# Altium footprint library HW_HOLLAND_NCDM_MONITOR_R1.PcbLib: 472 footprints (part 22 of 30)
Each footprint in its own frame and in the unit in brackets; x right, y up, seen from the top. Pads: shape width x height; smd on the part's side, far side on the other; paste and mask are expansions set on the pad; w line width, h text height; cw(c..) or ccw(c..) is an arc to the next point about the centre after c.
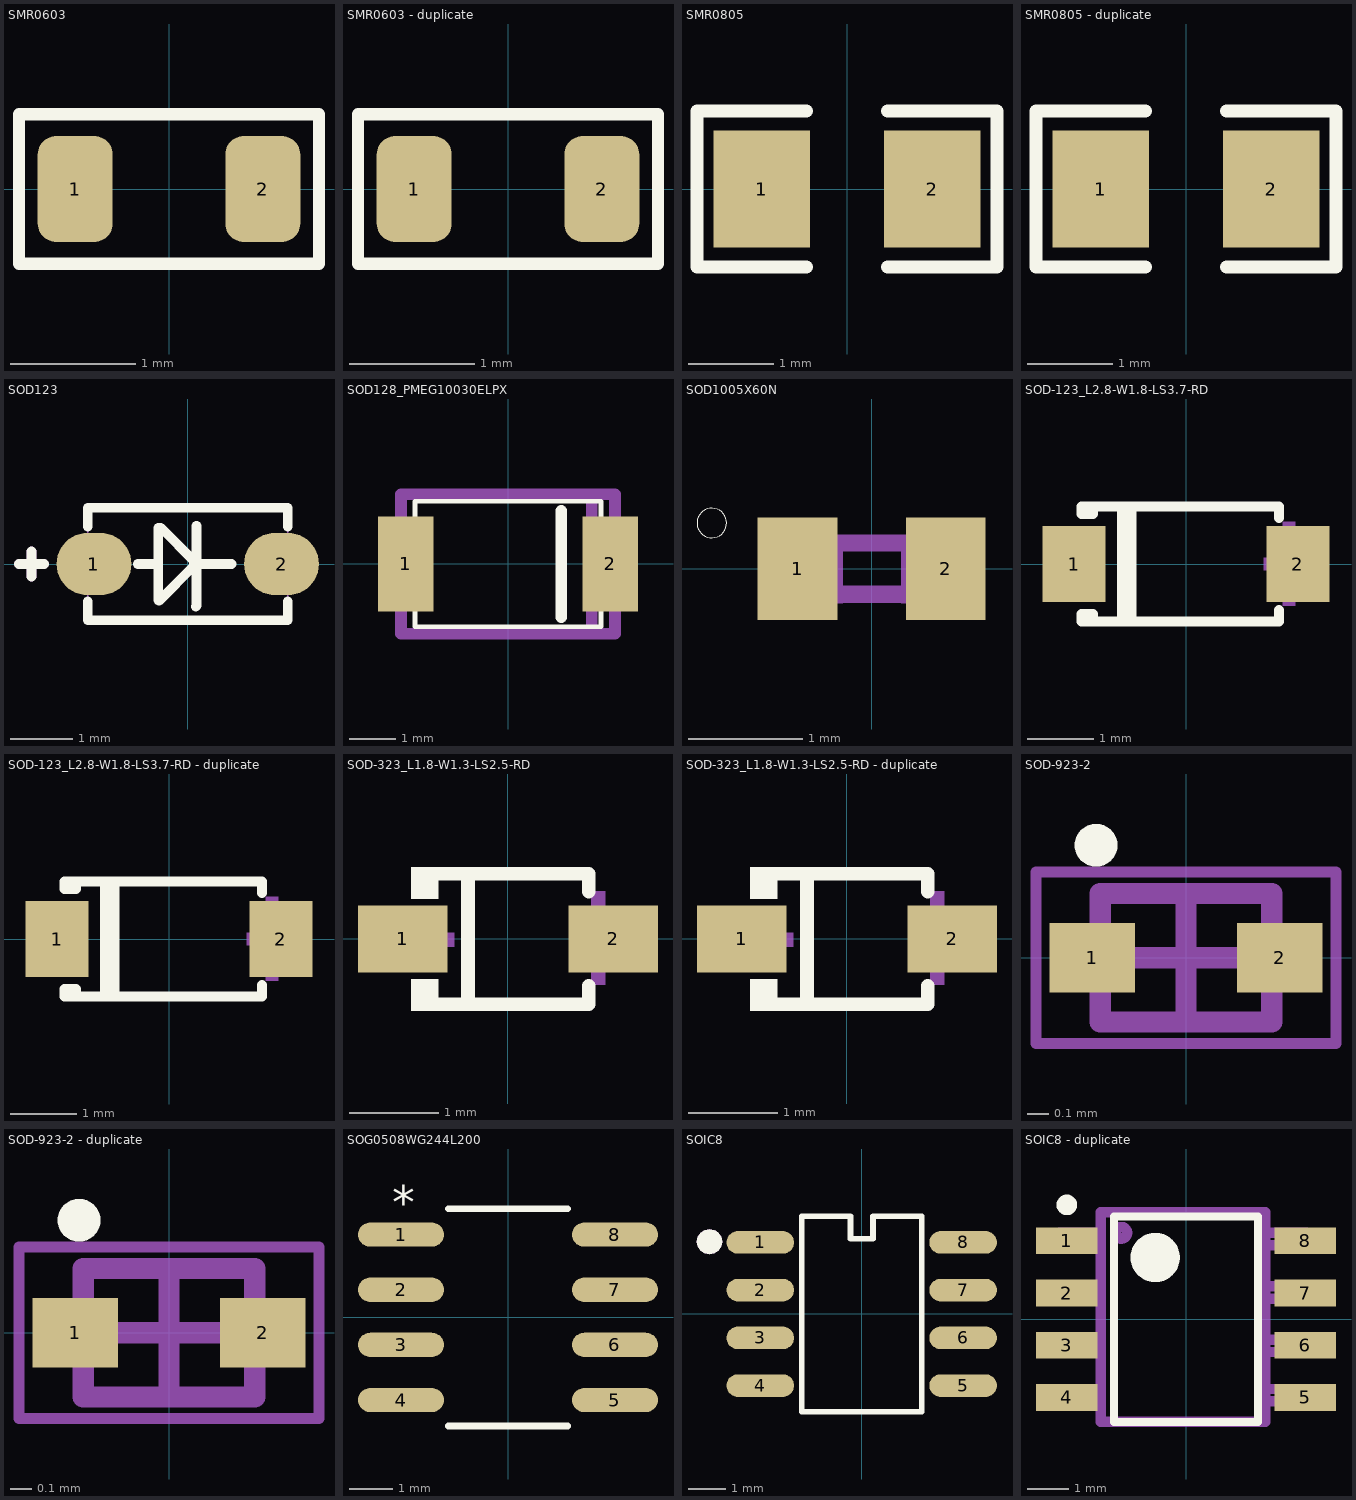
[diagram p21: the footprints below, top view; thin cyan lines are the x and y axes]

## SMR0603 [mm]
pads (2):
  rrect50% 0.6x0.85 smd: 1(-0.75,0) 2(0.75,0)
Top Overlay:
  lines w0.1: -1.2,-0.6 1.2,-0.6 1.2,0.6 -1.2,0.6 -1.2,-0.6
3D body "SMD R-0603.STEP": height 0.45, standoff -0.01, extent -0.8,-0.4 0.8,0.4

## SMR0603 - duplicate [mm]
pads (2):
  rrect50% 0.6x0.85 smd: 1(-0.75,0) 2(0.75,0)
Top Overlay:
  lines w0.1: -1.2,-0.6 1.2,-0.6 1.2,0.6 -1.2,0.6 -1.2,-0.6
3D body "SMD R-0603.STEP": height 0.45, standoff -0.01, extent -0.8,-0.4 0.8,0.4

## SMR0805 [mm]
pads (2):
  rect 1.133x1.377 smd: 1(-1,0) 2(1,0)
Top Overlay:
  lines w0.152: -0.476,-0.917 -1.761,-0.917 -1.761,0.917 -0.476,0.917 ; 0.476,-0.917 1.761,-0.917 1.761,0.917 0.476,0.917
3D body "User Library-0805 SMD Resistor.step": height 0.78, standoff 0, extent -1,-0.625 1,0.625

## SMR0805 - duplicate [mm]
pads (2):
  rect 1.133x1.377 smd: 1(-1,0) 2(1,0)
Top Overlay:
  lines w0.152: -0.476,-0.917 -1.761,-0.917 -1.761,0.917 -0.476,0.917 ; 0.476,-0.917 1.761,-0.917 1.761,0.917 0.476,0.917
3D body "User Library-0805 SMD Resistor.step": height 0.78, standoff 0, extent -1,-0.625 1,0.625

## SOD123 [mm] "SOD123"
height 3.5
pads (2):
  oval 1.2x1 smd: 1(-1.5,0) 2(1.5,0)
Top Overlay:
  lines w0.152: -2.7,0 -2.3,0 ; -2.5,-0.2 -2.5,0.2 ; -1.6,-0.6 -1.6,-0.9 1.6,-0.9 1.6,-0.6 ; -1.6,0.6 -1.6,0.9 1.6,0.9 1.6,0.6 ; -0.8,0 -0.53,0 ; 0.1,0 0.7,0 ; 0.13,-0.68 0.14,-0.67 0.14,0.61 ; -0.47,-0.58 -0.46,-0.59 0.11,-0.02 0.11,0.04 -0.43,0.58 -0.47,0.58 -0.47,-0.58
  text ".Designator" at 4.2,0.4 h0.76
Top Assembly:
  lines w0.025: -1.6,-0.9 1.6,-0.9 1.6,0.9 -1.6,0.9 -1.6,-0.9
  lines w0.152: -2.7,0 -2.3,0 ; -2.5,-0.2 -2.5,0.2
Mechanical 21:
  text "2" at 1.246,0 h0.64
  text "1" at -1.754,0 h0.64
3D body "User Library-SOD-123_DiodesInc.STEP": height 1.48, standoff 0.03, extent -1.893,-0.859 1.957,0.841

## SOD128_PMEG10030ELPX [mm]
pads (2):
  rect 1.2x2.05 smd: 1(-2.2,0) 2(2.2,0)
Top Overlay:
  lines w0.1: -2,-1.35 2,-1.35 2,1.35 -2,1.35 -2,-1.35
  lines w0.254: 1.143,-1.143 1.143,1.143
Top Designator:
  lines w0.254: 1.8,-1.5 1.8,1.5 ; -2.3,-1.5 2.3,-1.5 2.3,1.5 -2.3,1.5 -2.3,-1.5
  text ".Designator" at -2.812,-0.282 h1.25
3D body "SOD128_PMEG10030ELPX.step": height 1.1, standoff 0, extent -2.35,-1.35 2.35,1.35

## SOD1005X60N [mm]
pads (2):
  rect 0.7x0.9 smd: 1(-0.65,0) 2(0.65,0)
Top Overlay:
  circle w0: c-1.403,0.4 r0.13
Mechanical 13:
  region: -0.254,-0.305 -0.555,-0.305 -0.555,0.295 -0.254,0.295
  region: 0.559,-0.305 0.259,-0.305 0.259,0.295 0.559,0.295
  lines w0.152: -0.245,-0.224 0.245,-0.224 ; -0.245,0.224 0.245,0.224
3D body "ctvs_cd_all.step": height 1.23, standoff 0.01, extent -1.07,-0.61 1.07,0.61

## SOD-123_L2.8-W1.8-LS3.7-RD [mm]
pads (2):
  rect 0.95x1.15 smd: 1(-1.693,0) 2(1.693,0)
Top Overlay:
  lines w0.152: -0.97,-0.866 -0.97,0.866 ; -0.827,-0.866 -0.827,0.866 ; 1.406,-0.698 1.406,-0.866 -1.406,-0.866 ; 1.406,0.698 1.406,0.866 -1.406,0.866 ; -1.406,-0.866 -1.58,-0.866 -1.58,-0.755 -1.406,-0.755 -1.406,-0.866 ; -1.406,0.866 -1.58,0.866 -1.58,0.755 -1.406,0.755 -1.406,0.866
Mechanical 15:
  region: -2.03,0.095 -2.03,-0.095 -1.272,-0.095 -1.272,0.095
  region: 1.935,0.098 1.935,-0.092 1.177,-0.092 1.177,0.098
  region: 1.651,0.635 1.651,-0.629 1.461,-0.629 1.461,0.635
3D body "sod123.STEP": height 0.96, standoff -0.01, extent -1.979,-0.963 1.979,0.963

## SOD-123_L2.8-W1.8-LS3.7-RD - duplicate [mm]
pads (2):
  rect 0.95x1.15 smd: 1(-1.693,0) 2(1.693,0)
Top Overlay:
  lines w0.152: -0.97,-0.866 -0.97,0.866 ; -0.827,-0.866 -0.827,0.866 ; 1.406,-0.698 1.406,-0.866 -1.406,-0.866 ; 1.406,0.698 1.406,0.866 -1.406,0.866 ; -1.406,-0.866 -1.58,-0.866 -1.58,-0.755 -1.406,-0.755 -1.406,-0.866 ; -1.406,0.866 -1.58,0.866 -1.58,0.755 -1.406,0.755 -1.406,0.866
Mechanical 15:
  region: -2.03,0.095 -2.03,-0.095 -1.272,-0.095 -1.272,0.095
  region: 1.935,0.098 1.935,-0.092 1.177,-0.092 1.177,0.098
  region: 1.651,0.635 1.651,-0.629 1.461,-0.629 1.461,0.635
3D body "sod123.STEP": height 0.96, standoff -0.01, extent -1.979,-0.963 1.979,0.963

## SOD-323_L1.8-W1.3-LS2.5-RD [mm]
pads (2):
  rect 1x0.75 smd: 1(-1.173,0) 2(1.173,0)
Top Overlay:
  region: -0.775,-0.802 -0.775,-0.45 -1.08,-0.45 -1.08,-0.802
  region: -0.775,0.802 -0.775,0.45 -1.08,0.45 -1.08,0.802
  lines w0.152: -0.851,-0.726 0.901,-0.726 0.901,-0.52 ; -0.851,0.726 0.901,0.726 0.901,0.53 ; -0.447,-0.726 -0.447,0.726
Mechanical 15:
  region: 1.083,0.53 1.083,-0.51 0.927,-0.51 0.927,0.53
  region: 1.315,0.09 1.315,-0.066 0.691,-0.066 0.691,0.09
  region: -1.225,0.07 -1.225,-0.086 -0.601,-0.086 -0.601,0.07
3D body "SOD-323.STEP": height 1.17, standoff 0.02, extent -1.35,-0.723 1.35,0.723

## SOD-323_L1.8-W1.3-LS2.5-RD - duplicate [mm]
pads (2):
  rect 1x0.75 smd: 1(-1.173,0) 2(1.173,0)
Top Overlay:
  region: -0.775,0.802 -0.775,0.45 -1.08,0.45 -1.08,0.802
  region: -0.775,-0.802 -0.775,-0.45 -1.08,-0.45 -1.08,-0.802
  lines w0.152: -0.851,-0.726 0.901,-0.726 0.901,-0.52 ; -0.851,0.726 0.901,0.726 0.901,0.53 ; -0.447,-0.726 -0.447,0.726
Mechanical 15:
  region: -1.225,0.07 -1.225,-0.086 -0.601,-0.086 -0.601,0.07
  region: 1.315,0.09 1.315,-0.066 0.691,-0.066 0.691,0.09
  region: 1.083,0.53 1.083,-0.51 0.927,-0.51 0.927,0.53
3D body "SOD-323.STEP": height 1.17, standoff 0.02, extent -1.35,-0.723 1.35,0.723

## SOD-923-2 [mm]
pads (2):
  rect 0.4x0.325 smd: 1(-0.437,0) 2(0.437,0)
Top Overlay:
  circle w0.1: c-0.42,0.525 r0.05
Mechanical 13:
  lines w0.1: -0.4,-0.3 0.4,-0.3 0.4,0.3 -0.4,0.3 -0.4,-0.3
Mechanical 15:
  lines w0.05: -0.7,-0.4 0.7,-0.4 0.7,0.4 -0.7,0.4 -0.7,-0.4
  lines w0.1: -0.25,0 0.25,0 ; 0,-0.25 0,0.25
3D body: height 0.4, standoff 0, extent -0.4,-0.3 0.4,0.3
3D body "SOD-923 0.2mm Lead Width.step": height 0.44, standoff 0, extent -0.525,-0.325 0.525,0.325

## SOD-923-2 - duplicate [mm]
pads (2):
  rect 0.4x0.325 smd: 1(-0.437,0) 2(0.437,0)
Top Overlay:
  circle w0.1: c-0.42,0.525 r0.05
Mechanical 13:
  lines w0.1: -0.4,-0.3 0.4,-0.3 0.4,0.3 -0.4,0.3 -0.4,-0.3
Mechanical 15:
  lines w0.05: -0.7,-0.4 0.7,-0.4 0.7,0.4 -0.7,0.4 -0.7,-0.4
  lines w0.1: -0.25,0 0.25,0 ; 0,-0.25 0,0.25
3D body: height 0.4, standoff 0, extent -0.4,-0.3 0.4,0.3
3D body "SOD-923 0.2mm Lead Width.step": height 0.44, standoff 0, extent -0.525,-0.325 0.525,0.325

## SOG0508WG244L200 [mil]
height 20.47
pads (8):
  oval 78x22 smd: 1(-97,75) 2(-97,25) 3(-97,-25) 4(-97,-75) 5(97,-75) 6(97,-25) 7(97,25) 8(97,75)
Top Overlay:
  lines w6: -54.08,-98.5 54.08,-98.5 ; -54.08,98.5 54.08,98.5
  text "*" at -105,90 h30
3D body "User Library-SOIC-8-1.STEP": height 68.9, standoff 0, extent -118.11,-96.45 118.11,96.46

## SOIC8 [mm]
pads (8):
  oval 1.8x0.6 smd: 1(-2.7,1.902) 2(-2.7,0.632) 3(-2.7,-0.638) 4(-2.7,-1.908) 5(2.7,-1.908) 6(2.7,-0.638) 7(2.7,0.632) 8(2.7,1.902)
Top Overlay:
  dashed: -4.384,1.922 -4.359,1.794 -4.286,1.686 -4.178,1.613 -4.05,1.588 -3.922,1.613 -3.886,1.637 -3.814,1.686 -3.741,1.794 -3.716,1.922 -3.741,2.05 -3.814,2.158 -3.886,2.207 -3.922,2.231 -4.05,2.256 -4.178,2.231 -4.286,2.158 -4.359,2.05
  lines w0.152: -1.6,-2.603 1.6,-2.603 1.6,2.597 0.3,2.597 0.3,1.997 -0.3,1.997 -0.3,2.597 -1.6,2.597 -1.6,-2.603
  text ".Designator" at 0.635,0.212 h0.64
Top Assembly:
  dashed: -4.384,1.922 -4.359,1.794 -4.286,1.686 -4.178,1.613 -4.05,1.588 -3.922,1.613 -3.886,1.637 -3.814,1.686 -3.741,1.794 -3.716,1.922 -3.741,2.05 -3.814,2.158 -3.886,2.207 -3.922,2.231 -4.05,2.256 -4.178,2.231 -4.286,2.158 -4.359,2.05
  lines w0.025: -1.6,-2.6 -1.6,2.6 -0.3,2.6 -0.3,2 0.3,2 0.3,2.6 1.6,2.6 1.6,-2.6 -1.6,-2.6
Mechanical 17:
  text "1" at -2.334,1.902 h0.91
  text "3" at -2.334,-0.638 h0.91
  text "2" at -2.334,0.632 h0.91
  text "4" at -2.334,-1.908 h0.91
  text "6" at 3.066,-0.638 h0.91
  text "8" at 3.066,1.902 h0.91
  text "5" at 3.066,-1.908 h0.91
  text "7" at 3.066,0.632 h0.91
3D body: height 3.81, standoff 0, extent -3.65,-2.8 3.65,2.8

## SOIC8 - duplicate [mm]
pads (8):
  rect 1.5x0.65 smd: 1(-2.9,1.905) 2(-2.9,0.635) 3(-2.9,-0.635) 4(-2.9,-1.905) 5(2.9,-1.905) 6(2.9,-0.635) 7(2.9,0.635) 8(2.9,1.905)
Top Overlay:
  circle w0.6: c-0.75,1.5 r0.3
  circle w0.25: c-2.9,2.78 r0.125
  lines w0.2: -1.75,-2.5 1.75,-2.5 1.75,2.5 -1.75,2.5 -1.75,-2.5
Top Designator:
  circle w0.254: c-1.575,2.1 r0.141
  lines w0.254: -2.075,-2 -3.075,-2 -3.075,-1.7 -2.075,-1.7 ; -2.075,-0.8 -3.075,-0.8 -3.075,-0.5 -2.075,-0.5 ; -2.075,0.5 -3.075,0.5 -3.075,0.8 -2.075,0.8 ; -2.075,1.8 -3.075,1.8 -3.075,2.1 -2.075,2.1 ; 1.925,-2 2.925,-2 2.925,-1.7 1.925,-1.7 ; 1.925,-0.8 2.925,-0.8 2.925,-0.5 1.925,-0.5 ; 1.925,0.5 2.925,0.5 2.925,0.8 1.925,0.8 ; 1.925,1.8 2.925,1.8 2.925,2.1 1.925,2.1 ; -2.075,-2.5 -2.075,2.6 1.925,2.6 1.925,-2.5 -2.075,-2.5
  text ".Designator" at -7.618,-0.508 h1.52
3D body "SOIC8-150-50.STEP": height 1.91, standoff 0, extent -3,-2.45 3,2.45